# Altium footprint library 布洛电子PCB封装库-通用接插件.PcbLib: 103 footprints (part 5 of 7)
Each footprint in its own frame and in the unit in brackets; x right, y up, seen from the top. Pads: shape width x height; smd on the part's side, far side on the other; paste and mask are expansions set on the pad; w line width, h text height; cw(c..) or ccw(c..) is an arc to the next point about the centre after c.
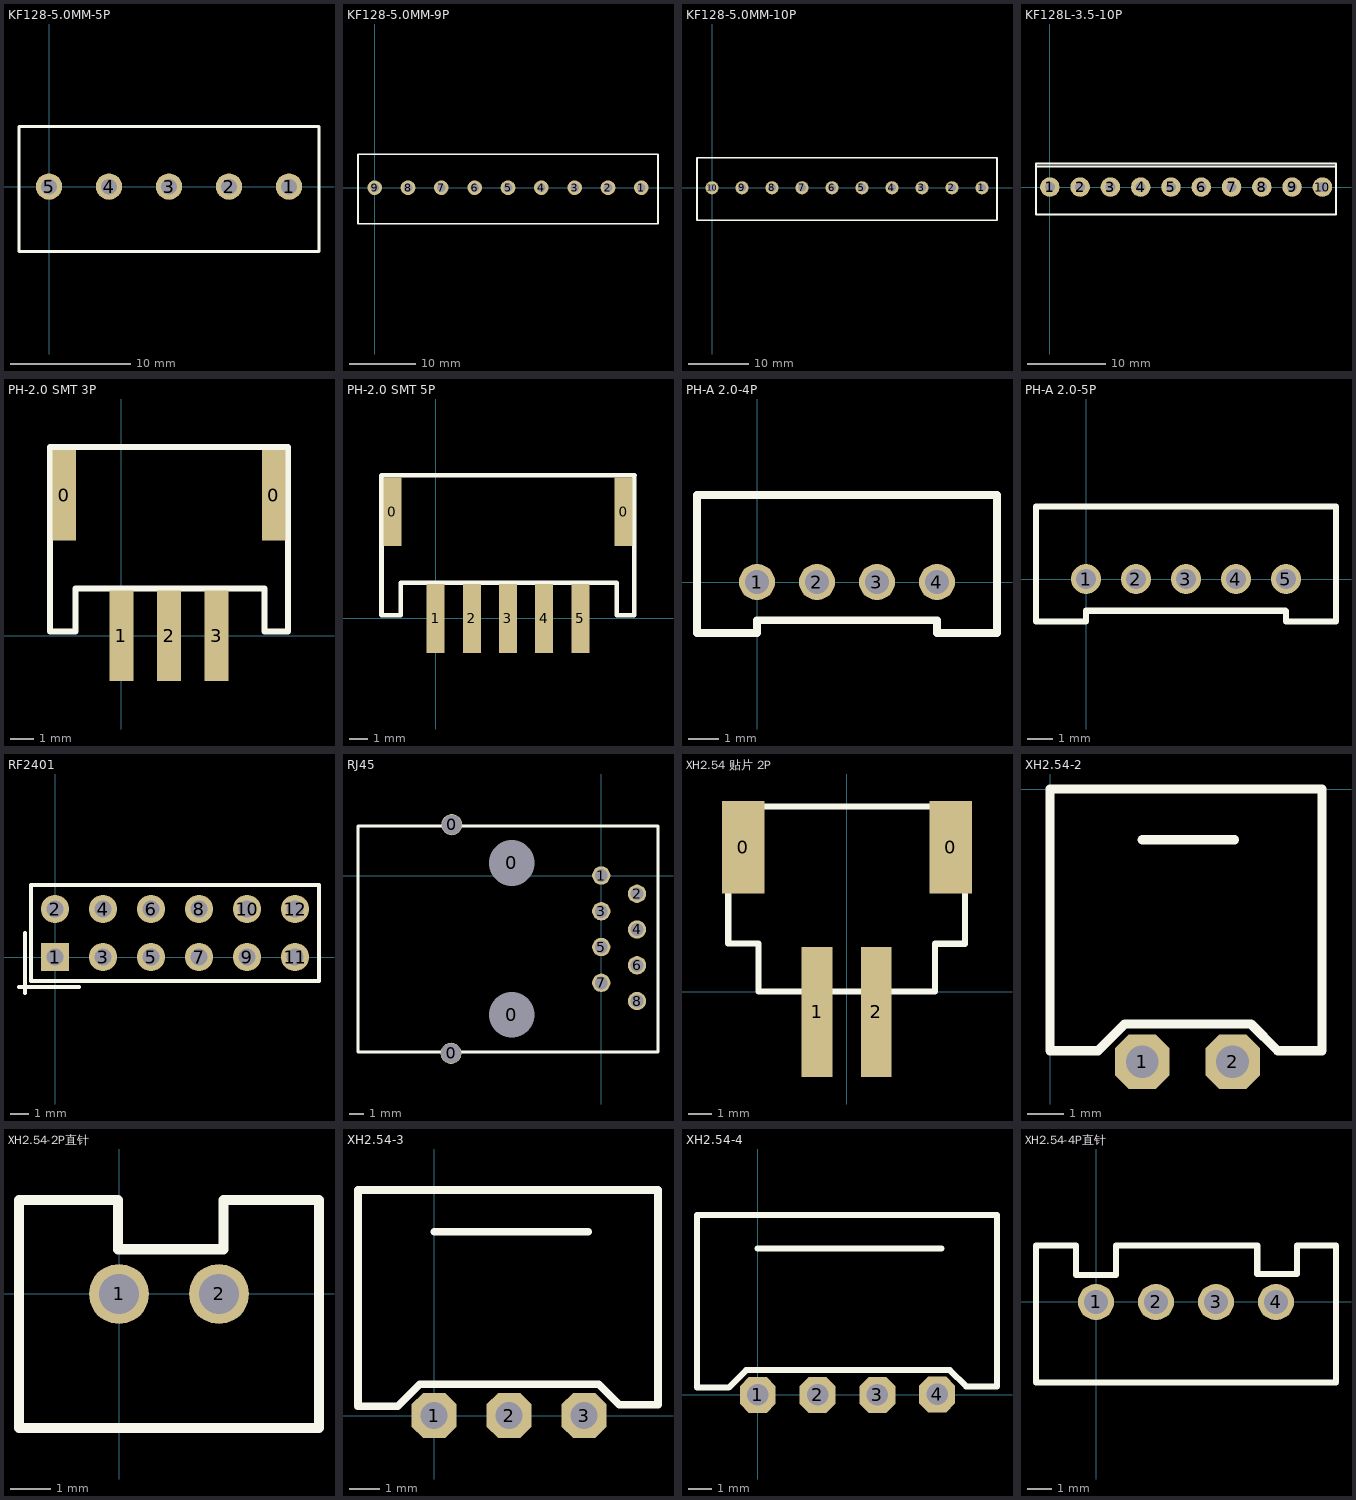
[diagram p4: the footprints below, top view; thin cyan lines are the x and y axes]

## KF128-5.0MM-5P [mm]
pads (5):
  round 2.2 hole 1.3: 1(20,0) 2(15,0) 3(10,0) 4(5,0) 5(0,0)
Top Overlay:
  lines w0.254: -2.5,-5.4 -2.5,0 -2.5,5 22.5,5 22.5,-5.4 -2.5,-5.4
3D body: height 14, standoff -4, extent -2.503,-5.5 12.497,5
3D body: height 14, standoff -4, extent 12.5,-5.5 22.5,5

## KF128-5.0MM-9P [mm]
pads (9):
  round 2.2 hole 1.3: 1(40,0) 2(35,0) 3(30,0) 4(25,0) 5(20,0) 6(15,0) 7(10,0) 8(5,0) 9(0,0)
Top Overlay:
  lines w0.254: -2.5,-5.4 -2.5,5 42.5,5 42.5,0 42.5,-5.4 -2.5,-5.4
3D body: height 14, standoff -4, extent -2.493,-5.5 7.507,5
3D body: height 14, standoff -4, extent 32.504,-5.522 42.504,4.978
3D body: height 14, standoff -4, extent 17.501,-5.522 32.501,4.978
3D body: height 14, standoff -4, extent 7.5,-5.5 17.5,5

## KF128-5.0MM-10P [mm]
pads (10):
  round 2.2 hole 1.3: 1(45,0) 2(40,0) 3(35,0) 4(30,0) 5(25,0) 6(20,0) 7(15,0) 8(10,0) 9(5,0) 10(0,0)
Top Overlay:
  lines w0.254: -2.5,-5.4 -2.5,0 -2.5,5 47.5,5 47.5,0 47.5,-5.4 -2.5,-5.4
3D body: height 14, standoff -4, extent 37.504,-5.522 47.504,4.978
3D body: height 14, standoff -4, extent 22.501,-5.522 37.501,4.978
3D body: height 14, standoff -4, extent 12.5,-5.5 22.5,5
3D body: height 14, standoff -4, extent -2.503,-5.5 12.497,5

## KF128L-3.5-10P [mm]
pads (10):
  round 2.5 hole 1.3: 1(0,0) 2(3.889,0) 3(7.778,0) 4(11.667,0) 5(15.556,0) 6(19.444,0) 7(23.333,0) 8(27.222,0) 9(31.111,0) 10(35,0)
Top Overlay:
  lines w0.254: -1.775,2.616 36.699,2.616 ; -1.75,-3.5 -1.75,0 -1.75,3 0,3 36.75,3 36.75,-3.5 0,-3.5 -1.75,-3.5

## PH-2.0 SMT 3P [mm]
pads (5):
  rect 1x3.8 smd: 0(-2.4,5.9) 0(6.4,5.9) 1(0,0) 2(2,0) 3(4,0)
Top Overlay:
  lines w0.254: -3,0.178 -3,7.925 2,7.925 7,7.925 7,0.178 6.02,0.178 6.02,1.981 -1.93,1.981 -1.93,0.178 -3,0.178

## PH-2.0 SMT 5P [mm]
pads (7):
  rect 1x3.8 smd: 0(-2.4,5.9) 0(10.4,5.9) 1(0,0) 2(2,0) 3(4,0) 4(6,0) 5(8,0)
Top Overlay:
  lines w0.254: 10.988,7.925 10.988,0.178 10.008,0.178 10.008,1.981 6.02,1.981 -1.93,1.981 -1.93,0.178 -3,0.178 -3,7.925 2,7.925 11,7.925

## PH-A 2.0-4P [mm]
pads (4):
  round 1.2 hole 0.8: 1(0,0) 2(2,0) 3(4,0) 4(6,0)
Top Overlay:
  lines w0.254: -2,-0.229 -2,2.9 0,2.9 8,2.9 8,-1.7 6.43,-1.7 6,-1.7 6,-1.27 0,-1.27 0,-1.7 -2,-1.7 -2,0

## PH-A 2.0-5P [mm]
pads (5):
  round 1.2 hole 0.8: 1(0,0) 2(2,0) 3(4,0) 4(6,0) 5(8,0)
Top Overlay:
  lines w0.254: -2,-0.229 -2,2.9 0,2.9 10,2.9 10,0 10,-1.7 8.001,-1.7 8.001,-1.295 7.976,-1.27 0,-1.27 0,-1.7 -2,-1.7 -2,0

## RF2401 [mm]
pads (12):
  rect 1.5x1.5 hole 0.9: 1(0,0)
  round 1.5 hole 0.9: 2(0,2.54) 3(2.54,0) 4(2.54,2.54) 5(5.08,0) 6(5.08,2.54) 7(7.62,0) 8(7.62,2.54) 9(10.16,0) 10(10.16,2.54) 11(12.7,0) 12(12.7,2.54)
Top Overlay:
  lines w0.2: -1.27,-1.27 -1.27,3.81 13.97,3.81 13.97,-1.27 -1.27,-1.27
  lines w0.203: -1.905,-1.587 1.27,-1.587 ; -1.587,-1.905 -1.587,1.27
3D body: height 57.51, standoff -4.96, extent -2.15,-1.27 14.85,32.73

## RJ45 [mm]
pads (12):
  round 1.5 hole 1.4: 0(-10.668,-12.624) 0(-10.617,3.607)
  round 1.8 hole 3.25: 0(-6.352,-9.883) 0(-6.35,0.889)
  round 1.3 hole 0.92: 1(0,0) 2(2.54,-1.295) 3(0,-2.54) 4(2.54,-3.832) 5(0,-5.082) 6(2.54,-6.375) 7(0,-7.62) 8(2.54,-8.915)
Top Overlay:
  lines w0.203: -17.272,-12.522 -17.272,3.518 4.028,3.518 4.028,-12.522 -17.272,-12.522
3D body: height 13.59, standoff -2.91, extent -17.279,-12.446 4.121,3.434

## XH2.54 贴片 2P [mm]
pads (4):
  rect 1.8x3.9 smd: 0(-4.369,6.096) 0(4.394,6.096)
  rect 1.3x5.5 smd: 1(-1.25,-0.864) 2(1.25,-0.864)
Top Overlay:
  lines w0.254: -3.734,2.032 -5,2.032 -5,7.8 -3.725,7.8 3.725,7.8 5,7.8 5,2.032 ; -3.725,2.023 -3.725,0 0,0 3.725,0 3.725,2.015 4.983,2.015

## XH2.54-2 [mm]
pads (2):
  oct 1.5x1.5 hole 0.9: 1(2.54,-7.518) 2(5.029,-7.518)
Top Overlay:
  lines w0.254: 2.54,-1.397 5.08,-1.397 ; 0,-7.214 1.321,-7.214 2.057,-6.477 5.537,-6.477 6.274,-7.214 7.493,-7.214 7.493,0 0,0 0,-7.214

## XH2.54-2P直针 [mm]
pads (2):
  round 1.5 hole 1: 1(0,0) 2(2.5,0)
Top Overlay:
  lines w0.254: -2.5,-3.35 5,-3.35 5,0 5,2.35 2.616,2.35 2.616,1.118 1.667,1.118 0.826,1.118 -0.025,1.118 -0.025,2.35 -2.5,2.35 -2.5,0 -2.5,-3.35
3D body: height 7.11, standoff -3.81, extent -2.489,-3.378 4.902,2.362

## XH2.54-3 [mm]
pads (3):
  oct 1.5x1.5 hole 0.9: 1(0,0) 2(2.5,0) 3(5,0)
Top Overlay:
  lines w0.254: 0,6.121 5.131,6.121 ; -2.54,0.305 -2.54,7.518 7.46,7.518 7.46,0.356 6.172,0.356 5.486,1.041 -0.483,1.041 -1.219,0.305 -2.54,0.305

## XH2.54-4 [mm]
pads (4):
  oct 1.5x1.5 hole 0.9: 1(0,0) 2(2.5,0) 3(5,0) 4(7.5,0.025)
Top Overlay:
  lines w0.254: 0,6.121 7.671,6.121 ; -2.54,0.305 -1.219,0.305 -0.483,1.041 8.026,1.041 8.712,0.356 10,0.356 10,7.518 -2.54,7.518 -2.54,0.305

## XH2.54-4P直针 [mm]
pads (4):
  round 1.5 hole 1: 1(0,0) 2(2.5,0) 3(5,0) 4(7.5,0)
Top Overlay:
  lines w0.254: -2.5,-3.35 -2.5,0 -2.5,2.35 -0.826,2.35 -0.826,1.118 0.826,1.118 0.826,2.35 6.718,2.35 6.718,1.168 8.37,1.168 8.37,2.35 10,2.35 10,0 10,-3.35 -2.5,-3.35
3D body: height 7, standoff -3.4, extent -2.441,-3.404 9.959,2.346